# Altium footprint library lib.PcbLib: 145 footprints (part 6 of 10)
Each footprint in its own frame and in the unit in brackets; x right, y up, seen from the top. Pads: shape width x height; smd on the part's side, far side on the other; paste and mask are expansions set on the pad; w line width, h text height; cw(c..) or ccw(c..) is an arc to the next point about the centre after c.
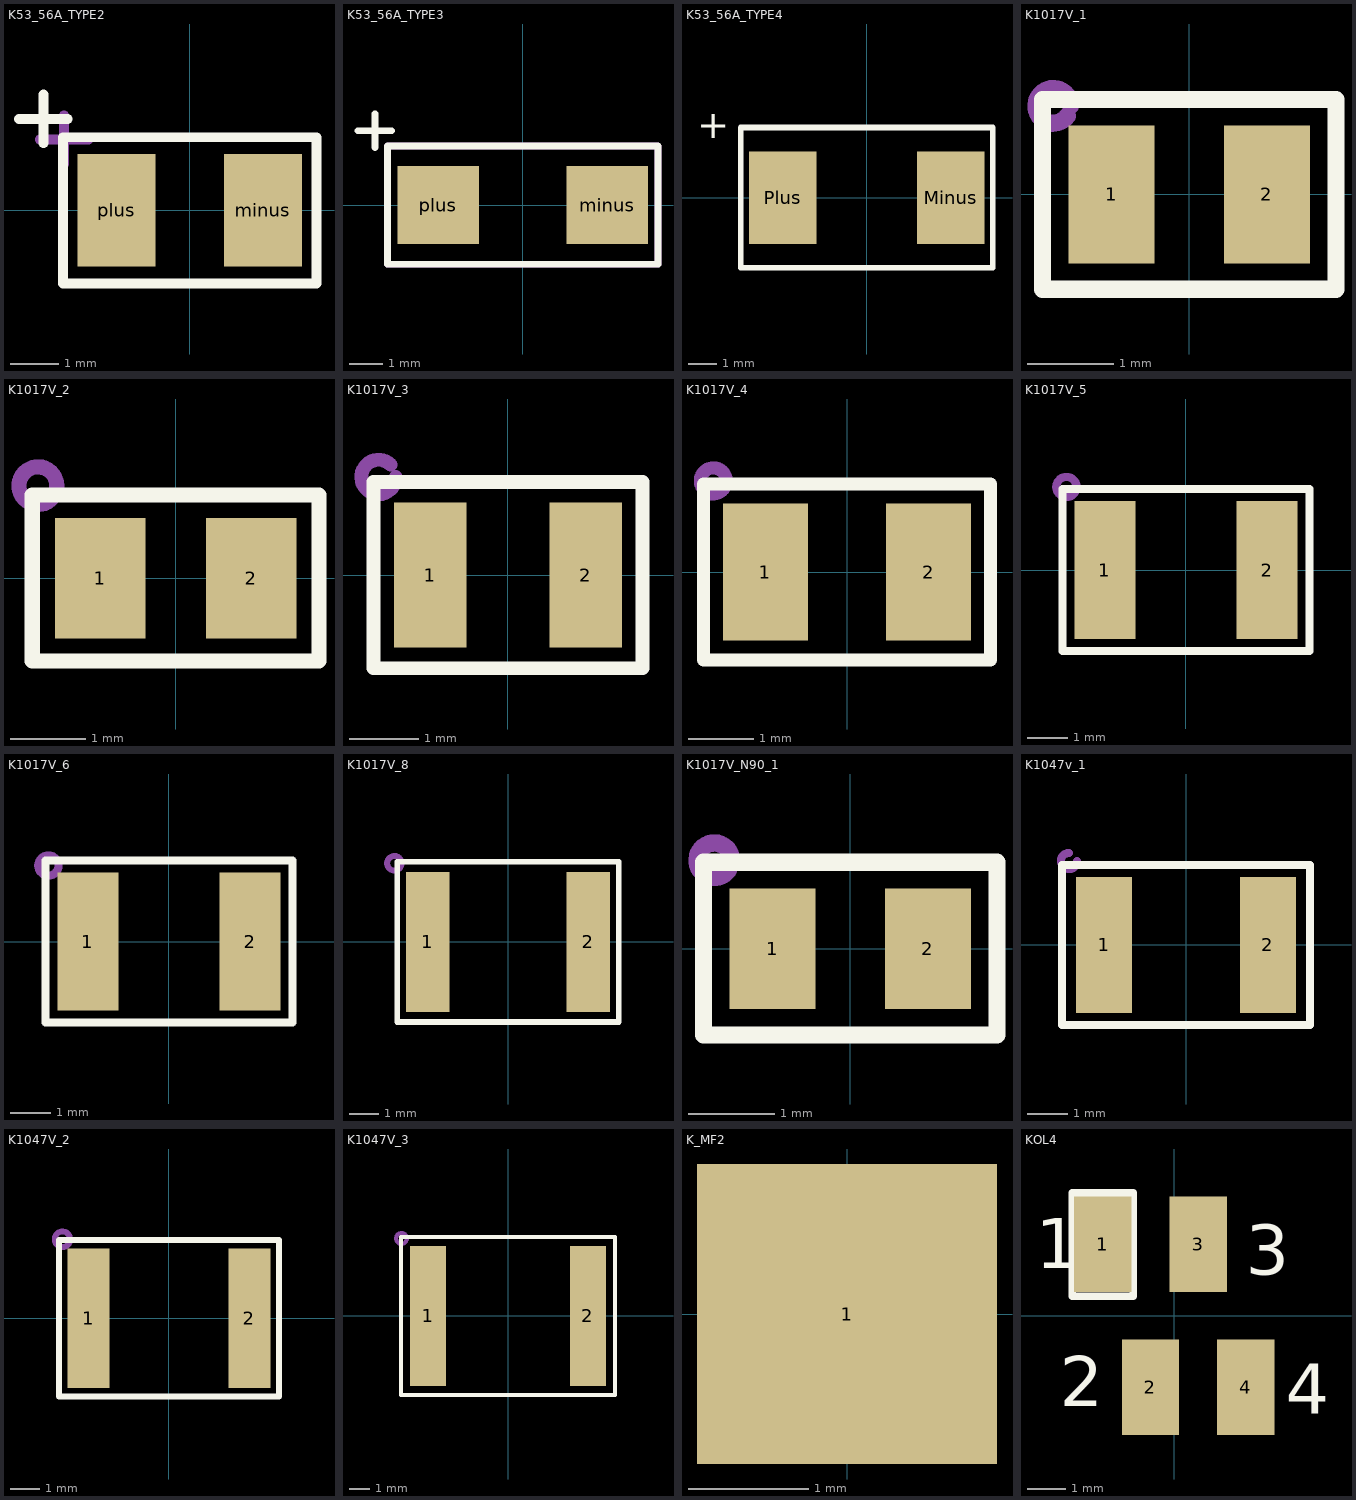
[diagram p5: the footprints below, top view; thin cyan lines are the x and y axes]

## K53_56A_TYPE2 [mm]
height 1.8
pads (2):
  rect 1.6x2.3 smd: minus(1.5,0) plus(-1.5,0)
Top Overlay:
  lines w0.2: -3.5,1.875 -2.5,1.875 ; -3,1.375 -3,2.375 ; -2.6,-1.5 -2.6,1.5 2.6,1.5 2.6,-1.5 -2.6,-1.5
Mechanical 25:
  lines w0.2: -3.075,1.45 -2.075,1.45 ; -2.575,0.95 -2.575,1.95
3D body: height 1, standoff 0, extent -1.8,-1 -1.7,1
3D body: height 1, standoff 0, extent 1.7,-1 1.8,1
3D body: height 1.8, standoff 0, extent -1.7,-1.4 1.7,1.4

## K53_56A_TYPE3 [mm]
height 2.5
pads (2):
  rect 2.4x2.3 smd: minus(2.5,0) plus(-2.5,0)
Top Overlay:
  lines w0.2: -4.875,2.2 -3.875,2.2 ; -4.375,1.7 -4.375,2.7 ; -4,-1.75 -4,1.75 4,1.75 4,-1.75 -4,-1.75
Mechanical 5:
  lines w0.2: -4,-1.75 4,-1.75 4,1.75 -4,1.75 -4,-1.75
Mechanical 25:
  text "+" at -4.5,0.9 h2
3D body: height 2.5, standoff 0, extent -3.2,-1.6 -2.5,1.6
3D body: height 2.5, standoff 0, extent -2.5,-1.6 3.2,1.6

## K53_56A_TYPE4 [mm]
height 2.8
pads (2):
  rect 2.4x3.3 smd: Minus(3,0) Plus(-3,0)
Top Overlay:
  lines w0.2: -4.5,-2.5 -4.5,2.5 4.5,2.5 4.5,-2.5 -4.5,-2.5
  text "+" at -6.059,2.113 h1
Mechanical 25:
  text "+" at -5.2,1.6 h2
3D body: height 2.8, standoff 0, extent -3.6,-2.2 -2.8,2.2
3D body: height 2.8, standoff 0, extent -2.8,-2.2 3.6,2.2

## K1017V_1 [mm] "massa 0.1gr"
height 1.2
pads (2):
  rect 1x1.6 smd: 1(-0.9,0) 2(0.9,0)
Top Overlay:
  lines w0.2: -1.7,-1.1 1.7,-1.1 1.7,1.1 -1.7,1.1 -1.7,-1.1
Mechanical 25:
  lines w0.2: -1.412,0.909 cw(c-1.575,1.025) -1.375,1.025
3D body: height 1.2, standoff 0, extent -0.75,-0.7 0.75,0.7

## K1017V_2 [mm]
pads (2):
  rect 1.2x1.6 smd: 1(-1,0) 2(1,0)
Top Overlay:
  lines w0.2: -1.9,-1.1 -1.9,1.1 1.9,1.1 1.9,-1.1 -1.9,-1.1
Mechanical 25:
  circle w0.2: c-1.825,1.225 r0.25
3D body: height 1.4, standoff 0, extent -0.75,-0.7 0.75,0.7

## K1017V_3 [mm]
height 1.2
pads (2):
  rect 1.05x2.1 smd: 1(-1.125,0) 2(1.125,0)
Top Overlay:
  lines w0.2: -1.95,-1.35 1.95,-1.35 1.95,1.35 -1.95,1.35 -1.95,-1.35
Mechanical 25:
  lines w0.2: -1.7,1.6 ccw(c-1.877,1.423) -1.627,1.423
3D body: height 1.2, standoff 0, extent -1,-0.95 1,0.95

## K1017V_4 [mm]
height 1.5
pads (2):
  rect 1.3x2.1 smd: 1(-1.25,0) 2(1.25,0)
Top Overlay:
  lines w0.2: -2.2,-1.35 -2.2,1.35 2.2,1.35 2.2,-1.35 -2.2,-1.35
Mechanical 25:
  circle w0.2: c-2.05,1.4 r0.2
3D body: height 1.6, standoff 0, extent -1,-0.9 1,0.9

## K1017V_5 [mm]
height 1.2
pads (2):
  rect 1.5x3.4 smd: 1(-2,0) 2(2,0)
Top Overlay:
  lines w0.2: -3.05,-2 3.05,-2 3.05,2 -3.05,2 -3.05,-2
Mechanical 25:
  lines w0.2: -3.2,2.05 ccw(c-2.95,2.05) -3.2,2.054
3D body: height 1.2, standoff 0, extent -2,-1.6 2,1.6

## K1017V_6 [mm]
height 2
pads (2):
  rect 1.5x3.4 smd: 1(-2,0) 2(2,0)
Top Overlay:
  lines w0.2: -3.05,-2 -3.05,2 3.05,2 3.05,-2 -3.05,-2
Mechanical 25:
  lines w0.2: -3.225,1.875 ccw(c-2.975,1.875) -3.225,1.879
3D body: height 2, standoff 0, extent -2,-1.6 2,1.6

## K1017V_8 [mm]
height 2
pads (2):
  rect 1.5x4.8 smd: 1(-2.75,0) 2(2.75,0)
Top Overlay:
  lines w0.2: -3.8,-2.75 -3.8,2.75 3.8,2.75 3.8,-2.75 -3.8,-2.75
Mechanical 25:
  circle w0.2: c-3.9,2.7 r0.25
3D body: height 2.4, standoff 0, extent -2.8,-2.3 2.8,2.3

## K1017V_N90_1 [mm] "massa 0.03"
height 1.1
pads (2):
  rect 1x1.4 smd: 1(-0.9,0) 2(0.9,0)
Top Overlay:
  lines w0.2: -1.7,-1 -1.7,1 1.7,1 1.7,-1 -1.7,-1
Mechanical 25:
  lines w0.2: -1.412,0.909 cw(c-1.575,1.025) -1.375,1.025
3D body: height 1.1, standoff 0, extent -0.8,-0.6 0.8,0.6

## K1047v_1 [mm]
height 1.8
pads (2):
  rect 1.4x3.4 smd: 1(-2.05,0) 2(2.05,0)
Top Overlay:
  lines w0.2: -3.1,-2 3.1,-2 3.1,2 -3.1,2 -3.1,-2
Mechanical 25:
  lines w0.2: -2.925,2.3 ccw(c-2.925,2.1) -2.725,2.1
3D body: height 2.5, standoff 0.5, extent -2,-1.6 2,1.6

## K1047V_2 [mm] "m=0.5"
height 3
pads (2):
  rect 1.45x4.8 smd: 1(-2.775,0) 2(2.775,0)
Top Overlay:
  lines w0.2: -3.8,-2.7 -3.8,2.7 3.8,2.7 3.8,-2.7 -3.8,-2.7
Mechanical 25:
  circle w0.2: c-3.675,2.725 r0.269
3D body: height 2.5, standoff 0, extent -2.8,-2.3 2.8,2.3

## K1047V_3 [mm] "3 type"
height 2.5
pads (2):
  rect 1.8x7 smd: 1(-4,0) 2(4,0)
Top Overlay:
  lines w0.2: -5.35,-3.95 -5.35,3.95 5.35,3.95 5.35,-3.95 -5.35,-3.95
Mechanical 25:
  circle w0.2: c-5.325,3.875 r0.269
3D body: height 2.5, standoff 0, extent -4,-3.4 4,3.4

## K_MF2 [mm]
height 0.5
pads (1):
  rect 2.5x2.5 smd: 1(0,0)
3D body: height 0.25, standoff 0, extent -1.25,-1.25 1.25,1.25

## KOL4 [mm]
pads (4):
  rect 1.5x2.5 smd: 1(-1.875,1.875) 2(-0.625,-1.875) 3(0.625,1.875) 4(1.875,-1.875)
Top Overlay:
  lines w0.2: -2.675,0.515 -1.075,0.515 -1.075,3.215 -2.675,3.215 -2.675,0.515
  text "2" at -3,-2.375 h1.31
  text "3" at 1.875,1.075 h1.31
  text "1" at -3.625,1.25 h1.31
  text "4" at 2.925,-2.575 h1.31
Mechanical 25:
  text "4" at 3.025,-2.375 h2
  text "3" at 1.725,1.175 h2
  text "2" at -2.5,-2.5 h2
  text "1" at -3.5,1.125 h2